# Altium footprint library Conectores.PcbLib: 122 footprints (part 6 of 8)
Each footprint in its own frame and in the unit in brackets; x right, y up, seen from the top. Pads: shape width x height; smd on the part's side, far side on the other; paste and mask are expansions set on the pad; w line width, h text height; cw(c..) or ccw(c..) is an arc to the next point about the centre after c.
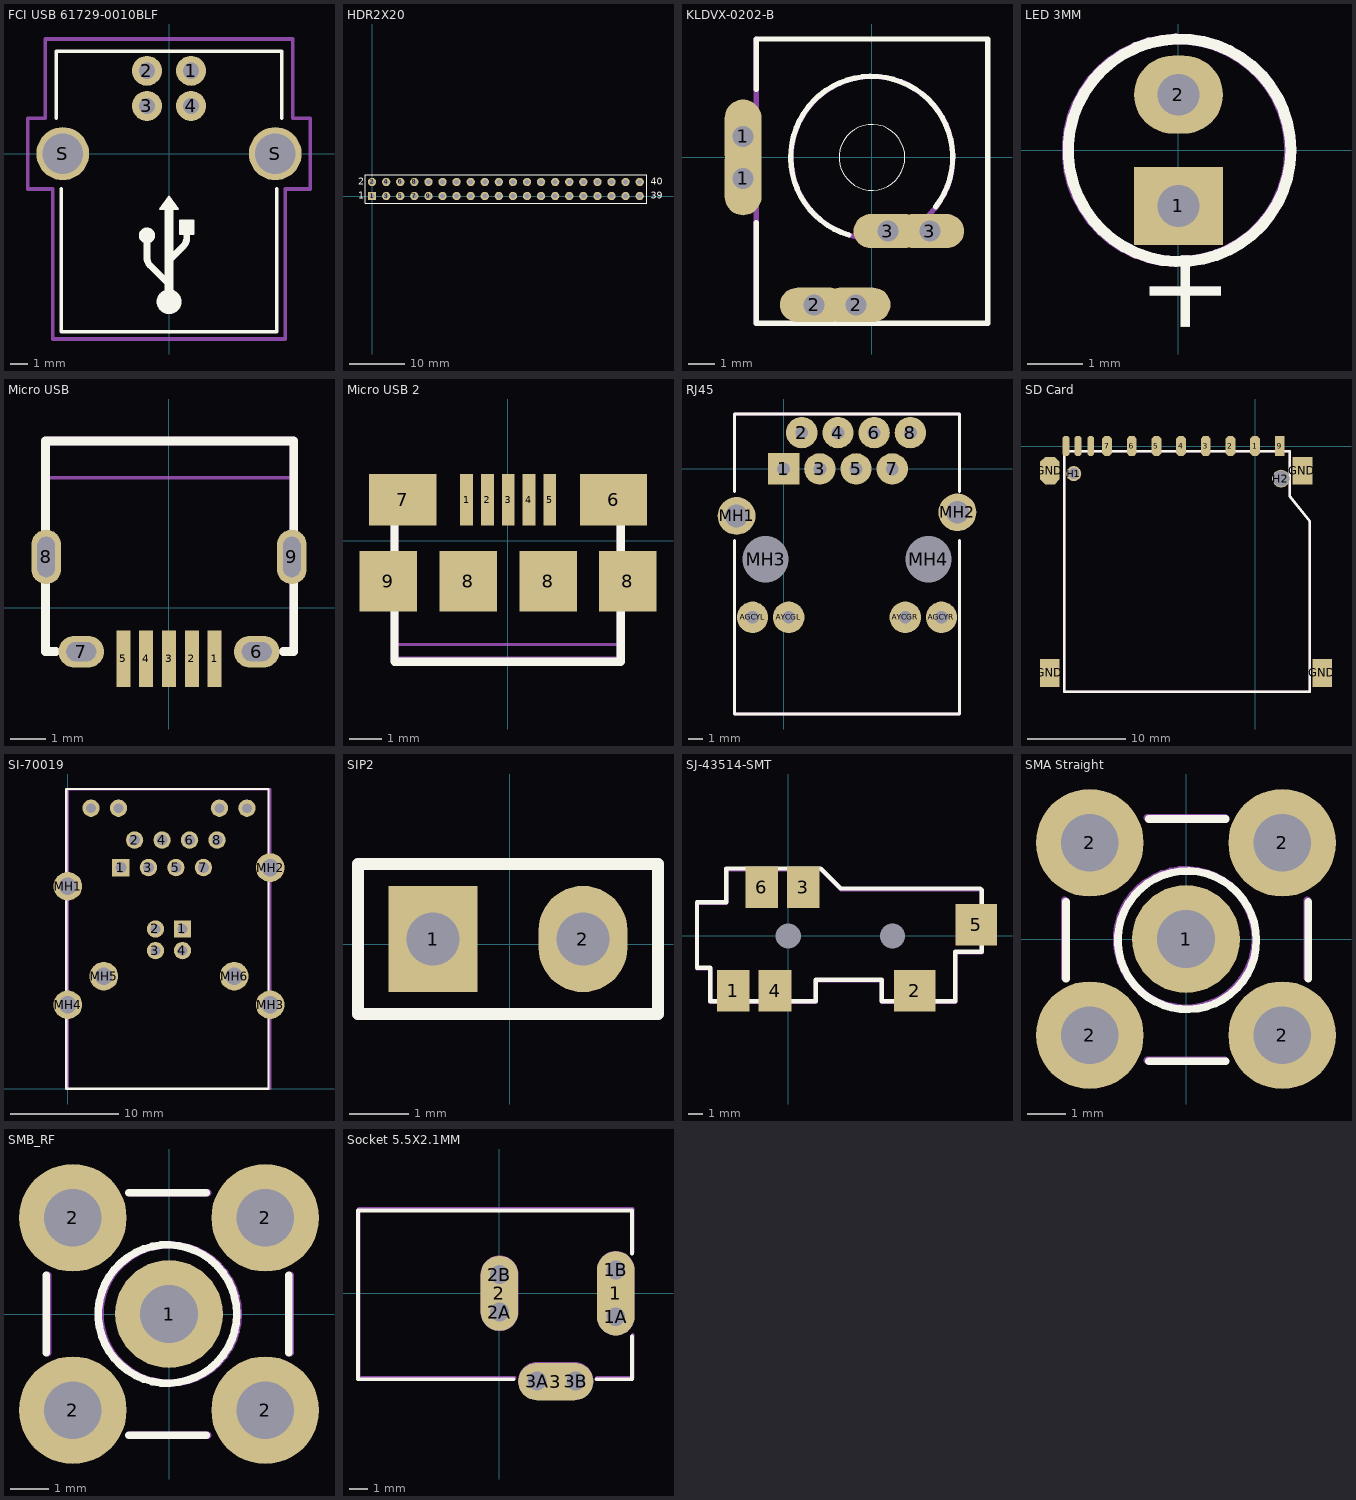
[diagram p5: the footprints below, top view; thin cyan lines are the x and y axes]

## FCI USB 61729-0010BLF [mm] "USB Type D"
height 11
pads (6):
  round 1.7 hole 0.92: 1(1.25,4.7) 2(-1.25,4.7) 3(-1.25,2.71) 4(1.25,2.71)
  round 3 hole 2.3: S(-6.02,0) S(6.02,0)
Top Overlay:
  circle w0.889: c0,-8.388 r0.254
  circle w0.508: c-1.25,-4.638 r0.2
  region: 0,-2.438 0.5,-3.138 -0.5,-3.138
  region: 1.375,-3.788 1.375,-4.538 0.625,-4.538 0.625,-3.788
  lines w0.127: -0.5,-3.138 0,-2.438 0.5,-3.138 -0.5,-3.138 ; 0.625,-4.538 0.625,-3.788 1.375,-3.788 1.375,-4.538 0.625,-4.538
  lines w0.2: -6.4,2 -6.4,5.8 6.4,5.8 6.4,2 ; -6.1,-2 -6.1,-10.1 6.1,-10.1 6.1,-2
  lines w0.381: -1.25,-4.638 -1.25,-5.888 ccw(c-0.61,-5.888) -1.062,-6.341 -0.062,-7.341 ; 0.062,-5.991 0.812,-5.241 ccw(c0.36,-4.788) 1,-4.788 1,-4.538
  lines w0.508: 0,-7.888 0,-3.138
Mechanical 15:
  lines w0.2: -8,-2 -6.6,-2 -6.6,-10.5 0,-10.5 6.6,-10.5 6.6,-2 8,-2 8,2 7,2 7,6.5 0,6.5 -7,6.5 -7,2 -8,2 -8,-2
3D body "FCI 61729-0010BLF.STEP": height 11, standoff -2.8, extent -6.56,-10.175 6.56,5.765

## HDR2X20 [mm] "Connector; Header; 20x2 Position"
pads (40):
  rect 1.5x1.5 hole 0.9: 1(0,0)
  round 1.5 hole 0.9: 2(0,2.54) 3(2.54,0) 4(2.54,2.54) 5(5.08,0) 6(5.08,2.54) 7(7.62,0) 8(7.62,2.54) 9(10.16,0) 10(10.16,2.54) 11(12.7,0) 12(12.7,2.54) 13(15.24,0) 14(15.24,2.54) 15(17.78,0) 16(17.78,2.54) 17(20.32,0) 18(20.32,2.54) 19(22.86,0) 20(22.86,2.54) 21(25.4,0) 22(25.4,2.54) 23(27.94,0) 24(27.94,2.54) 25(30.48,0) 26(30.48,2.54) 27(33.02,0) 28(33.02,2.54) 29(35.56,0) 30(35.56,2.54) 31(38.1,0) 32(38.1,2.54) 33(40.64,0) 34(40.64,2.54) 35(43.18,0) 36(43.18,2.54) 37(45.72,0) 38(45.72,2.54) 39(48.26,0) 40(48.26,2.54)
Top Overlay:
  lines w0.2: -1.27,-1.27 -1.27,3.81 49.53,3.81 49.53,-1.27 -1.27,-1.27
  text "39" at 50.292,-0.508 h1.27
  text "40" at 50.292,2.032 h1.27
  text "2" at -2.54,2.032 h1.27
  text "1" at -2.54,-0.508 h1.27

## KLDVX-0202-B [mil]
pads (6):
  oval 55.12x110.24 hole 31.5: 1(-192.91,-31.5) 1(-192.91,31.5)
  oval 102.36x51.18 hole 31.5: 2(-86.61,-220.47) 2(-23.62,-220.47) 3(23.62,-110.24) 3(86.61,-110.24)
Top Overlay:
  circle w0: c0,0 r49.22
  lines w8: -173.23,-97.83 -173.23,-248.03 173.23,-248.03 173.23,177.17 -173.23,177.17 -173.23,101.97 ; -34.45,-116.14 cw(c-0.48,0.16) 95.47,-73.82
Mechanical 13:
  lines w0: -208.66,-68.9 -208.66,68.9 -177.17,68.9 -177.17,-68.9 -208.66,-68.9 ; -114.17,-236.22 -114.17,-204.72 3.94,-204.72 3.94,-236.22 -114.17,-236.22 ; -3.94,-125.98 -3.94,-94.49 114.17,-94.49 114.17,-125.98 -3.94,-125.98
Mechanical 18:
  circle w8: c0,0 r121.07
  lines w8: -173.23,-248.03 -173.23,177.17
3D body "KLDVX-0202-A Kycon.step": height 602.36, standoff -137.8, extent -202.36,-251.18 175.59,181.89

## LED 3MM [mm]
pads (2):
  rect 1.6x1.4 hole 0.75: 1(0,-1)
  oval 1.6x1.4 hole 0.75: 2(0,1)
Top Overlay:
  circle w0.2: c0.02,0 r2
  text "+" at 0.77,-3.39 h1.5
Mechanical 29:
  circle w0.2: c0,0 r2
  text "'.Designator'" at -0.428,2.408 h0.5
  text "+" at 0.75,-3.39 h1.5
3D body "LEDd3R.STEP": height 5.51, standoff -2.49, extent -1.701,-1.679 1.587,1.621

## Micro USB [mm] "FCI uUSB 10118194-0001LF"
pads (9):
  rect 0.4x1.6 smd: 1(1.3,-1.452) 2(0.65,-1.452) 3(0,-1.452) 4(-0.65,-1.452) 5(-1.3,-1.452)
  oval 1.3x0.9 hole 0.55 slot 0.85 at 0 deg: 6(2.5,-1.248) 7(-2.5,-1.248)
  oval 0.85x1.55 hole 0.5 slot 1.15 at 90 deg: 8(-3.5,1.452) 9(3.5,1.452)
Top Overlay:
  lines w0.254: -3.231,-1.248 -3.523,-1.248 -3.523,4.752 3.556,4.752 3.556,-1.248 3.264,-1.248
Mechanical 1:
  lines w0.1: -3.396,3.702 3.429,3.702
Mechanical 29:
  lines w0.254: -3.231,-1.248 -3.523,-1.248 -3.523,4.752 3.556,4.752 3.556,-1.248 3.264,-1.248
  text "'.Designator'" at 0.082,-0.206 h0.5
3D body "User Library-MicroUSB-B_Molex_105017-0001.step": height 2.58, standoff -0.72, extent -4.1,-1.398 4.1,4.032

## Micro USB 2 [mm] "10118192-0001LF"
pads (11):
  rect 0.4x1.6 smd: 1(-1.295,1.275) 2(-0.645,1.275) 3(0.005,1.275) 4(0.655,1.275) 5(1.305,1.275)
  rect 2.1x1.6 smd: 6(3.305,1.275) 7(-3.295,1.275)
  rect 1.8x1.9 smd: 8(-1.245,-1.275) 8(1.255,-1.275) 8(3.745,-1.275) 9(-3.745,-1.275)
Top Overlay:
  lines w0.254: -3.259,1.042 -3.551,1.042 -3.551,-3.795 3.528,-3.795 3.528,1.042 3.236,1.042
Mechanical 1:
  lines w0.1: -3.424,-3.258 3.401,-3.258
Mechanical 29:
  lines w0.254: -3.259,1.072 -3.551,1.072 -3.551,-3.765 3.528,-3.765 3.528,1.072 3.236,1.072
  text "'.Designator'" at -0.268,-3.022 h0.5
3D body "10118192.step": height 2.74, standoff -0.27, extent -3.961,-3.936 3.951,1.725

## PCBComponent_1 [mm]

## PCBComponent_1 - duplicate [mm]

## RJ45 [mm]
pads (16):
  rect 2.2x2.2 hole 0.9: 1(0,0)
  round 2.2 hole 0.9: 2(1.27,2.54) 3(2.54,0) 4(3.81,2.54) 5(5.08,0) 6(6.35,2.54) 7(7.62,0) 8(8.89,2.54) AGCYL(-2.184,-10.414) AGCYR(11.074,-10.414) AYCGL(0.356,-10.414) AYCGR(8.534,-10.414)
  round 2.65 hole 1.6: MH1(-3.302,-3.302) MH2(12.192,-3.048)
  round 2.95 hole 3.25 unplated: MH3(-1.27,-6.35) MH4(10.16,-6.35)
Top Overlay:
  lines w0.2: -3.44,-5.026 -3.44,-17.2 12.33,-17.2 12.33,-5.026 ; -3.44,-1.578 -3.44,3.85 12.33,3.85 12.33,-1.578
Mechanical 29:
  lines w0.2: -3.44,-5.026 -3.44,-17.2 12.33,-17.2 12.33,-5.026 ; -3.44,-1.578 -3.44,3.85 12.33,3.85 12.33,-1.578
  text "'.Designator'" at -2.728,-16.542 h0.5
  text "1" at -0.05,-2.49 h0.8
3D body "RJ45-8P-Pipe-Cat6.step": height 3.15, standoff -15, extent -4.367,-16.583 13.233,7.417

## SD Card [mm]
pads (17):
  oct 1x2 smd: 1(0,0) 2(-2.5,0) 3(-5,0) 4(-7.5,0) 5(-10,0) 6(-12.5,0) 7(-15,0)
  oct 0.7x2 smd: 8(-16.65,0) CD(-17.95,0) WP(-19.15,0)
  rect 1x2 smd: 9(2.5,0)
  rect 2x2.8 smd: GND(-20.8,-23) GND(4.8,-2.5) GND(6.8,-23)
  oct 2x2.8 smd: GND(-20.8,-2.5)
  round 1.524 hole 1.1: H1(-18.375,-2.8)
  round 1.8 hole 1.6: H2(2.625,-3.3)
Top Overlay:
  lines w0.254: -19.344,-24.912 5.548,-24.912 5.548,-7.64 3.516,-5.1 3.516,-0.528 -19.344,-0.528 -19.344,-24.912
Mechanical 29:
  lines w0.254: -19.344,-24.892 -19.344,-0.508 3.516,-0.508 3.516,-5.08 5.548,-7.62 5.548,-24.892 -19.344,-24.892
  text "'.Designator'" at -18.408,-24.062 h0.5
3D body "SD SOKET HAFIZALI.STEP": height 3.01, standoff -0.99, extent -21.183,-35.043 7.417,0.457

## SI-70019 [mm] "RJ45 + USB type B"
pads (22):
  rect 1.6x1.6 hole 1: 1(4.9,20.442)
  rect 1.6x1.6 hole 0.9: 1(10.585,14.772)
  round 1.6 hole 1: 2(6.17,22.982) 3(7.44,20.442) 4(8.71,22.982) 5(9.98,20.442) 6(11.25,22.982) 7(12.52,20.442) 8(13.79,22.982)
  round 1.6 hole 0.9: 2(8.095,14.772) 3(8.095,12.772) 4(10.585,12.772) AGCYL(2.14,25.932) AGCYR(16.54,25.932) AYCGL(4.68,25.932) AYCGR(14,25.932)
  round 2.65 hole 1.6: MH1(0,18.722) MH2(18.69,20.442) MH3(18.69,7.772) MH4(0,7.772) MH5(3.325,10.412) MH6(15.365,10.412)
Top Overlay:
  lines w0.2: -0.15,0.01 -0.15,27.704 18.54,27.704 18.54,0.01 -0.15,0.01
Mechanical 29:
  lines w0.2: 0,-0.008 18.69,-0.008 18.69,27.686 0,27.686 0,-0.008
  text "1" at 4.97,18.23 h0.8
  text "'.Designator'" at 0.652,0.668 h0.5

## SIP2 [mm] "Jumper / SIP2"
pads (2):
  rect 1.5x1.8 hole 0.9: 1(-1.298,0.086)
  oval 1.5x1.8 hole 0.9: 2(1.242,0.086)
Top Overlay:
  lines w0.2: -2.568,-1.184 -2.568,1.356 2.512,1.356 2.512,-1.184 -2.568,-1.184
Mechanical 29:
  lines w0.2: -2.568,-1.184 2.512,-1.184 2.512,1.356 -2.568,1.356 -2.568,-1.184
  text "1" at -1.45,1.69 h0.8
  text "'.Designator'" at 0.272,-0.978 h0.5
3D body "HDR1x2.STEP": height 10.1, standoff -1.5, extent -2.573,-1.165 2.507,1.375

## SJ-43514-SMT [mm] "3.5 MM AUDIO JACKS"
pads (8):
  rect 2.2x2.8 smd: 1(-3.7,-3.7) 3(1,3.285) 4(-0.9,-3.7) 6(-1.8,3.285)
  rect 2.8x2.8 smd: 2(8.5,-3.7) 5(12.632,0.75)
  round 0.6 hole 1.7 unplated: MH1(0,0) MH2(7,0)
Top Overlay:
  lines w0.3: -5.258,-4.405 -5.232,-4.38 1.854,-4.38 1.854,-2.957 6.274,-2.957 6.274,-2.983 6.274,-4.38 6.299,-4.405 11.227,-4.405 11.227,-1.052 13.005,-1.052 13.005,3.088 12.903,3.19 11.684,3.19 9.271,3.19 3.531,3.19 2.184,4.536 -4.166,4.536 -4.166,2.275 -4.445,2.275 -6.147,2.275 -6.147,-2.144 -5.258,-2.144 -5.258,-4.329 ; -3.505,4.536 -2.972,4.536
Mechanical 29:
  lines w0.3: -5.258,-4.445 -5.232,-4.42 1.854,-4.42 1.854,-2.997 6.274,-2.997 6.274,-3.023 6.274,-4.42 6.299,-4.445 11.227,-4.445 11.227,-1.092 13.005,-1.092 13.005,3.048 12.903,3.15 11.684,3.15 9.271,3.15 3.531,3.15 2.184,4.496 -4.166,4.496 -4.166,2.235 -4.445,2.235 -6.147,2.235 -6.147,-2.184 -5.258,-2.184 -5.258,-4.369 ; -3.505,4.496 -2.972,4.496
  text "'.Designator'" at -5.548,-0.102 h0.5
3D body "SJ-43516-SMT.stp": height 5.5, standoff -0.3, extent -6.196,-4.521 13.004,4.479

## SMA Straight [mm] "RP-SMA Connector"
pads (5):
  round 2.8 hole 1.5: 1(-0.003,0.011) 2(-2.503,-2.489) 2(-2.503,2.511) 2(2.497,-2.489) 2(2.497,2.511)
Top Overlay:
  circle w0.2: c0.027,-0.019 r1.8
  lines w0.2: -3.123,-1.019 -3.123,0.981 ; -0.973,-3.169 1.027,-3.169 ; -0.973,3.131 1.027,3.131 ; 3.177,-1.019 3.177,0.981
Mechanical 1:
  circle w0.025: c-0.003,0.011 r0.2
  circle w0.025: c-0.003,0.011 r1.05
  circle w0.025: c-0.003,0.011 r1.8
Mechanical 29:
  circle w0.2: c-0.003,0.011 r1.8
  lines w0.2: -3.153,-0.989 -3.153,1.011 ; -1.003,-3.139 0.997,-3.139 ; -1.003,3.161 0.997,3.161 ; 3.147,-0.989 3.147,1.011
  text "'.Designator'" at 3.52,-0.17 h0.5
3D body "LNB.step": height 3.6, standoff -10.1, extent -3.253,-3.239 3.247,3.261

## SMB_RF [mm]
pads (5):
  round 2.8 hole 1.5: 1(-0.003,0.011) 2(-2.503,-2.489) 2(-2.503,2.511) 2(2.497,-2.489) 2(2.497,2.511)
Top Overlay:
  circle w0.2: c-0.043,0.011 r1.8
  lines w0.2: -3.193,-0.989 -3.193,1.011 ; -1.043,-3.139 0.957,-3.139 ; -1.043,3.161 0.957,3.161 ; 3.107,-0.989 3.107,1.011
Mechanical 1:
  circle w0.025: c-0.003,0.011 r0.2
  circle w0.025: c-0.003,0.011 r1.05
  circle w0.025: c-0.003,0.011 r1.8
Mechanical 29:
  circle w0.2: c-0.003,0.011 r1.8
  lines w0.2: -3.153,-0.989 -3.153,1.011 ; -1.003,-3.139 0.997,-3.139 ; -1.003,3.161 0.997,3.161 ; 3.147,-0.989 3.147,1.011
  text "'.Designator'" at 3.532,-0.092 h0.5
3D body "smb right angle pcb.step": height 8.57, standoff -3.87, extent -3.081,-3.1 10.381,3.25

## Socket 5.5X2.1MM [mm] "5.5X2.1MM Electrical socket outlet DC-005 DC outlet"
pads (9):
  oval 2x4.5 all layers, no hole: 1(6.2,0)
  round 1.5 hole 1: 1A(6.2,-1.25) 1B(6.2,1.25) 2A(0,-1) 2B(0,1) 3A(2.007,-4.674) 3B(4.064,-4.674)
  oval 2x4 all layers, no hole: 2(0,0)
  oval 4x2 all layers, no hole: 3(3,-4.7)
Top Overlay:
  lines w0.2: 0.76,-4.58 -7.54,-4.58 -7.54,4.42 7.06,4.42 7.06,2.12 ; 5.16,-4.58 7.06,-4.58 7.06,-2.28
Mechanical 1:
  lines w1: 0,-1 0,1 ; 2,-5 4,-5 ; 6.2,-1.25 6.2,1.25
  text "Alert PCB fab to slot details" at -7.214,6.066 h0.3
  text "Assign keep-out area to slot" at -7.214,6.566 h0.3
  text "Mech 1 - Slot cut-out" at -7.214,5.566 h0.3
  text "Mech 2 - Clearance, move to internal plane if present" at -7.214,5.066 h0.3
Mechanical 2:
  lines w2.016: 0,-1 0,1 ; 2.007,-4.674 4.007,-4.674 ; 6.2,-1.25 6.2,1.25
Mechanical 29:
  lines w0.2: 0.8,-4.5 -7.5,-4.5 -7.5,4.5 7.1,4.5 7.1,2.2 ; 5.2,-4.5 7.1,-4.5 7.1,-2.2
  text "'.Designator'" at -7.008,-3.972 h0.5
3D body "User Library-PowerJack-2_5x5_7mm.step": height 11, standoff -3.5, extent -8.407,-4.773 6.793,4.627